# Altium footprint library 13-IC Packages-3pic.PcbLib: 49 footprints (part 1 of 4)
Each footprint in its own frame and in the unit in brackets; x right, y up, seen from the top. Pads: shape width x height; smd on the part's side, far side on the other; paste and mask are expansions set on the pad; w line width, h text height; cw(c..) or ccw(c..) is an arc to the next point about the centre after c.
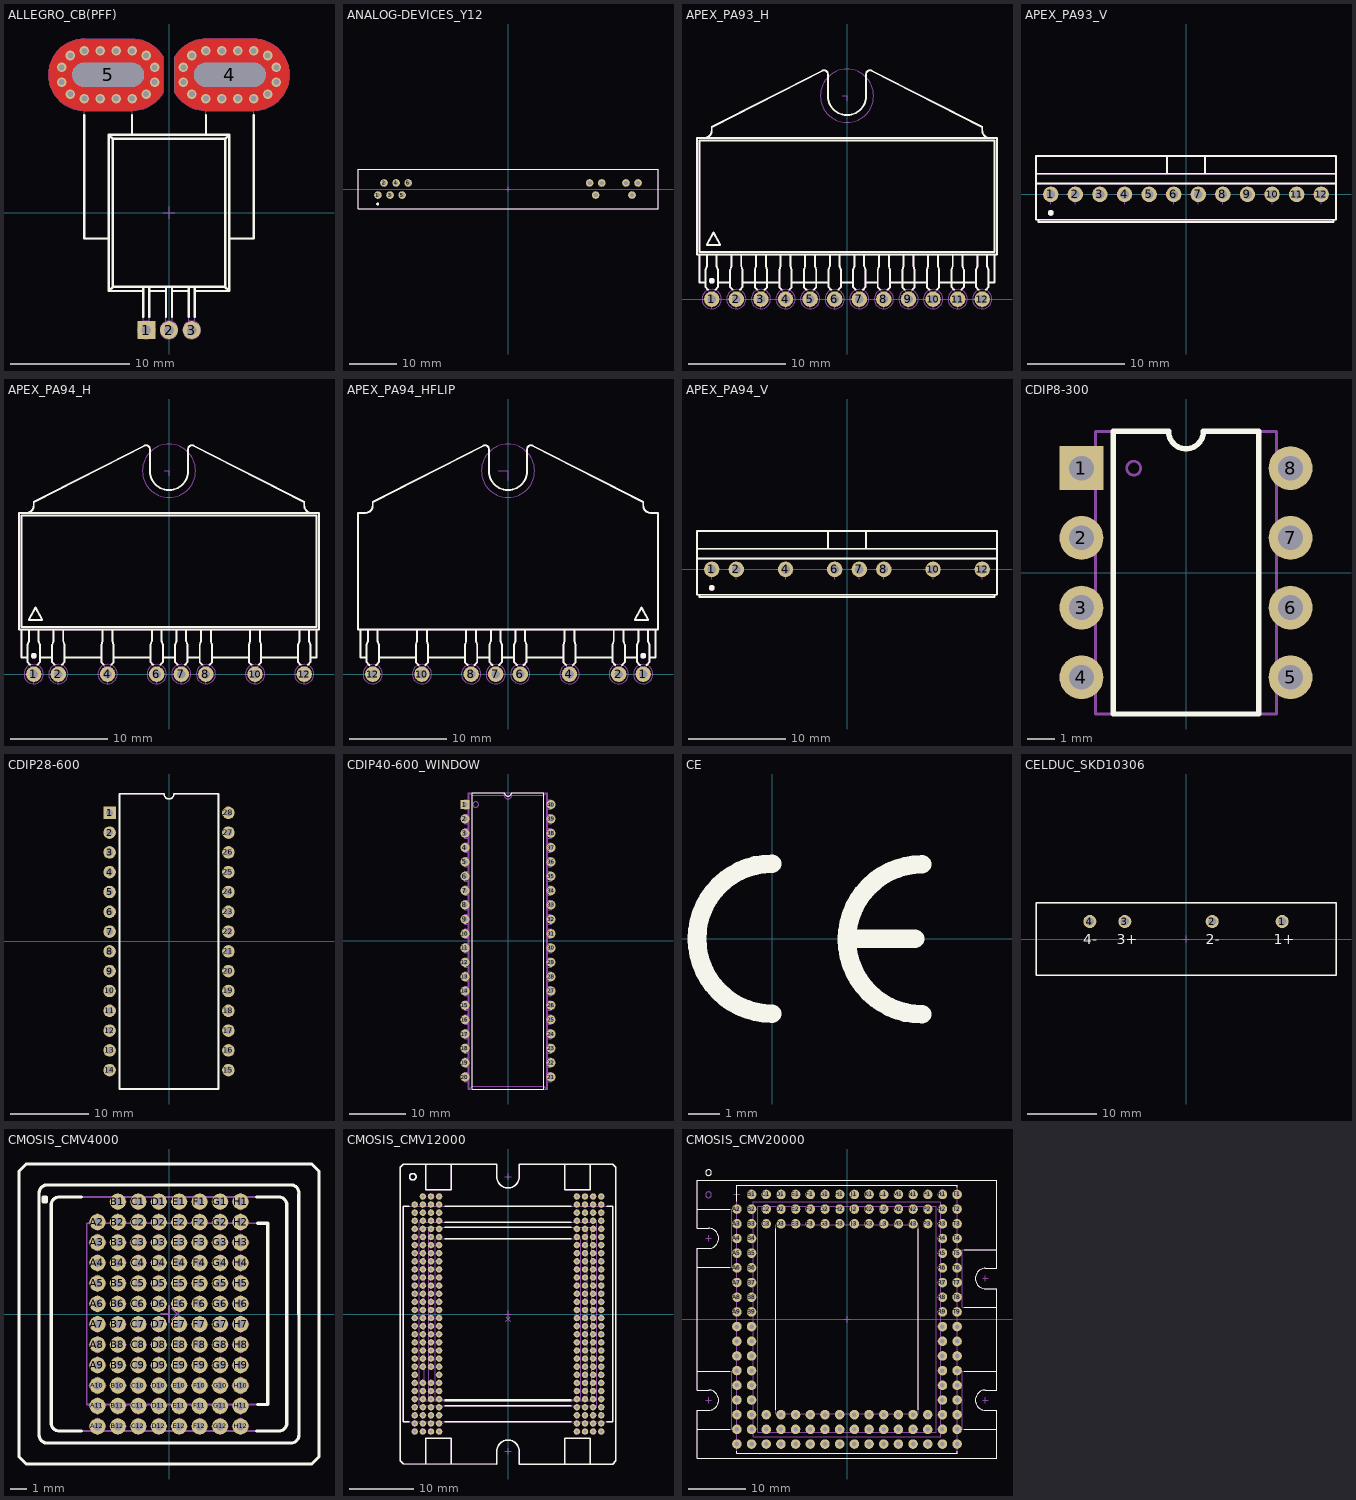
[diagram p0: the footprints below, top view; thin cyan lines are the x and y axes]

## ALLEGRO_CB(PFF) [mm] "ALLGRO MICROSYSTEMS Package CB, 5-pin package, leadform PFF"
height 7.1
pads (5):
  rect 1.5x1.5 hole 0.8: 1(-1.9,-9.822)
  round 1.5 hole 0.8: 2(0,-9.822) 3(1.9,-9.822)
  rrect100% 6x2 hole 2 slot 6 at 0 deg: 4(5.1,11.578) 5(-5.1,11.578)
via -7.1,13.578 diameter 0.8 hole 0.5
via -5.77,13.578 diameter 0.8 hole 0.5
via -4.43,13.578 diameter 0.8 hole 0.5
via -3.1,13.578 diameter 0.8 hole 0.5
via -1.924,13.196 diameter 0.8 hole 0.5
via -1.198,12.196 diameter 0.8 hole 0.5
via -1.198,10.96 diameter 0.8 hole 0.5
via -1.924,9.96 diameter 0.8 hole 0.5
via -3.1,9.578 diameter 0.8 hole 0.5
via -4.43,9.578 diameter 0.8 hole 0.5
via -5.77,9.578 diameter 0.8 hole 0.5
via -7.1,9.578 diameter 0.8 hole 0.5
via -8.276,9.96 diameter 0.8 hole 0.5
via -9.002,10.96 diameter 0.8 hole 0.5
via -9.002,12.196 diameter 0.8 hole 0.5
via -8.276,13.196 diameter 0.8 hole 0.5
via 1.198,12.196 diameter 0.8 hole 0.5
via 1.924,13.196 diameter 0.8 hole 0.5
via 3.1,13.578 diameter 0.8 hole 0.5
via 4.43,13.578 diameter 0.8 hole 0.5
via 5.77,13.578 diameter 0.8 hole 0.5
via 7.1,13.578 diameter 0.8 hole 0.5
via 8.276,13.196 diameter 0.8 hole 0.5
via 9.002,12.196 diameter 0.8 hole 0.5
via 9.002,10.96 diameter 0.8 hole 0.5
via 8.276,9.96 diameter 0.8 hole 0.5
via 7.1,9.578 diameter 0.8 hole 0.5
via 5.77,9.578 diameter 0.8 hole 0.5
via 4.43,9.578 diameter 0.8 hole 0.5
via 3.1,9.578 diameter 0.8 hole 0.5
via 1.924,9.96 diameter 0.8 hole 0.5
via 1.198,10.96 diameter 0.8 hole 0.5
Top Layer:
  region: -7.1,8.578 -7.336,8.578 -7.803,8.652 -8.252,8.798 -8.672,9.012 -9.054,9.29 -9.388,9.623 -9.666,10.005 -9.88,10.426 -10.026,10.875 -10.1,11.342 -10.1,11.814 -10.026,12.28 -9.88,12.729 -9.666,13.15 -9.388,13.532 -9.054,13.866 -8.672,14.144 -8.252,14.358 -7.803,14.504 -7.336,14.578 -7.1,14.578 -3.1,14.578 -2.903,14.578 -2.513,14.526 -2.132,14.424 -1.769,14.273 -1.428,14.076 -1.116,13.836 -0.838,13.558 -0.598,13.245 -0.5,13.074 -0.5,10.081 -0.598,9.91 -0.838,9.598 -1.116,9.319 -1.428,9.079 -1.769,8.882 -2.132,8.731 -2.513,8.629 -2.903,8.578 -3.1,8.578
  region: 0.5,10.081 0.598,9.91 0.838,9.598 1.116,9.319 1.428,9.079 1.769,8.882 2.132,8.731 2.513,8.629 2.903,8.578 3.1,8.578 7.1,8.578 7.336,8.578 7.803,8.652 8.252,8.798 8.672,9.012 9.054,9.29 9.388,9.623 9.666,10.005 9.88,10.426 10.026,10.875 10.1,11.342 10.1,11.814 10.026,12.28 9.88,12.729 9.666,13.15 9.388,13.532 9.054,13.866 8.672,14.144 8.252,14.358 7.803,14.504 7.336,14.578 7.1,14.578 3.1,14.578 2.903,14.578 2.513,14.526 2.132,14.424 1.769,14.273 1.428,14.076 1.116,13.836 0.838,13.558 0.598,13.245 0.5,13.074
Bottom Layer:
  region: -7.1,8.578 -7.336,8.578 -7.803,8.652 -8.252,8.798 -8.672,9.012 -9.054,9.29 -9.388,9.623 -9.666,10.005 -9.88,10.426 -10.026,10.875 -10.1,11.342 -10.1,11.814 -10.026,12.28 -9.88,12.729 -9.666,13.15 -9.388,13.532 -9.054,13.866 -8.672,14.144 -8.252,14.358 -7.803,14.504 -7.336,14.578 -7.1,14.578 -3.1,14.578 -2.903,14.578 -2.513,14.526 -2.132,14.424 -1.769,14.273 -1.428,14.076 -1.116,13.836 -0.838,13.558 -0.598,13.245 -0.5,13.074 -0.5,10.081 -0.598,9.91 -0.838,9.598 -1.116,9.319 -1.428,9.079 -1.769,8.882 -2.132,8.731 -2.513,8.629 -2.903,8.578 -3.1,8.578
  region: 0.5,10.081 0.598,9.91 0.838,9.598 1.116,9.319 1.428,9.079 1.769,8.882 2.132,8.731 2.513,8.629 2.903,8.578 3.1,8.578 7.1,8.578 7.336,8.578 7.803,8.652 8.252,8.798 8.672,9.012 9.054,9.29 9.388,9.623 9.666,10.005 9.88,10.426 10.026,10.875 10.1,11.342 10.1,11.814 10.026,12.28 9.88,12.729 9.666,13.15 9.388,13.532 9.054,13.866 8.672,14.144 8.252,14.358 7.803,14.504 7.336,14.578 7.1,14.578 3.1,14.578 2.903,14.578 2.513,14.526 2.132,14.424 1.769,14.273 1.428,14.076 1.116,13.836 0.838,13.558 0.598,13.245 0.5,13.074
Top Overlay:
  lines w0.2: -7.1,8.178 -7.1,-2.15 -5.1,-2.15 ; -3.1,6.55 -3.1,8.178 ; -2.155,-8.701 -2.155,-6.2 ; -2.155,-6.55 -5.05,-6.55 ; -1.645,-8.701 -1.645,-6.2 ; -1.645,-6.55 -0.255,-6.55 ; -0.255,-8.701 -0.255,-6.2 ; 0.255,-8.701 0.255,-6.2 ; 0.255,-6.55 1.645,-6.55 ; 1.645,-8.701 1.645,-6.2 ; 2.155,-8.701 2.155,-6.2 ; 2.155,-6.55 5.05,-6.55 ; 3.1,6.55 3.1,8.178 ; 5.1,-2.15 7.1,-2.15 7.1,8.178 ; -5.05,-6.55 -4.7,-6.2 ; -5.05,-6.55 -5.05,6.55 ; -5.05,6.55 -4.7,6.2 ; -5.05,6.55 5.05,6.55 ; -4.7,-6.2 -4.7,6.2 ; -4.7,-6.2 4.7,-6.2 ; -4.7,6.2 4.7,6.2 ; 4.7,-6.2 4.7,6.2 ; 4.7,-6.2 5.05,-6.55 ; 4.7,6.2 5.05,6.55 ; 5.05,-6.55 5.05,6.55
Mechanical 8:
  drawing of 258 lines, arcs and shapes, not listed
Mechanical 14:
  lines w0.1: -5.1,-2.15 -7.1,-2.15 -7.1,12.45 -3.1,12.45 -3.1,6.55 ; -2.155,-6.55 -5.05,-6.55 ; -2.155,-6.2 -2.155,-10.319 -1.645,-10.319 -1.645,-6.2 ; -1.645,-6.55 -0.255,-6.55 ; -0.255,-6.2 -0.255,-10.319 0.255,-10.319 0.255,-6.2 ; 0.255,-6.55 1.645,-6.55 ; 1.645,-6.2 1.645,-10.319 2.155,-10.319 2.155,-6.2 ; 2.155,-6.55 5.05,-6.55 ; 3.1,6.55 3.1,12.45 7.1,12.45 7.1,-2.15 5.1,-2.15 ; -5.05,-6.55 -4.7,-6.2 ; -5.05,-6.55 -5.05,6.55 ; -5.05,6.55 -4.7,6.2 ; -5.05,6.55 5.05,6.55 ; -4.7,-6.2 -4.7,6.2 ; -4.7,-6.2 4.7,-6.2 ; -4.7,6.2 4.7,6.2 ; 4.7,-6.2 4.7,6.2 ; 4.7,-6.2 5.05,-6.55 ; 4.7,6.2 5.05,6.55 ; 5.05,-6.55 5.05,6.55
3D body "ALLEGRO_CB(PFF).stp": height 7.1, standoff -3.5, extent -7.1,-10.319 7.1,12.45

## ANALOG-DEVICES_Y12 [mm] "Power SIP, Y12 Package Style, Pitch 2.54mm, Body 63mm X 8.3mm"
height 6.86
pads (12):
  round 1.6 hole 0.9: 1(-27.305,-1.27) 2(-26.035,1.27) 3(-24.765,-1.27) 4(-23.495,1.27) 5(-22.225,-1.27) 6(-20.955,1.27) 36(17.145,1.27) 37(18.415,-1.27) 38(19.685,1.27) 42(24.765,1.27) 43(26.035,-1.27) 44(27.305,1.27)
Top Overlay:
  circle w0.3: c-27.37,-3.155 r0.15
  lines w0.2: -31.496,-4.128 -31.496,4.128 31.496,4.128 31.496,-4.128 -31.496,-4.128
Mechanical 8:
  lines w0.1: -27.805,-1.27 -27.305,-1.27 ; -27.305,-1.77 -27.305,-1.27 ; -27.305,-0.77 -27.305,-1.27 ; -26.805,-1.27 -27.305,-1.27 ; -26.535,1.27 -26.035,1.27 ; -26.035,0.77 -26.035,1.27 ; -26.035,1.77 -26.035,1.27 ; -25.535,1.27 -26.035,1.27 ; -25.265,-1.27 -24.765,-1.27 ; -24.765,-1.77 -24.765,-1.27 ; -24.765,-0.77 -24.765,-1.27 ; -24.265,-1.27 -24.765,-1.27 ; -23.995,1.27 -23.495,1.27 ; -23.495,0.77 -23.495,1.27 ; -23.495,1.77 -23.495,1.27 ; -22.995,1.27 -23.495,1.27 ; -22.725,-1.27 -22.225,-1.27 ; -22.225,-1.77 -22.225,-1.27 ; -22.225,-0.77 -22.225,-1.27 ; -21.725,-1.27 -22.225,-1.27 ; -21.455,1.27 -20.955,1.27 ; -20.955,0.77 -20.955,1.27 ; -20.955,1.77 -20.955,1.27 ; -20.455,1.27 -20.955,1.27 ; -0.5,0 0,0 ; 0,-0.5 0,0 ; 0,0.5 0,0 ; 0.5,0 0,0 ; 16.645,1.27 17.145,1.27 ; 17.145,0.77 17.145,1.27 ; 17.145,1.77 17.145,1.27 ; 17.645,1.27 17.145,1.27 ; 17.915,-1.27 18.415,-1.27 ; 18.415,-1.77 18.415,-1.27 ; 18.415,-0.77 18.415,-1.27 ; 18.915,-1.27 18.415,-1.27 ; 19.185,1.27 19.685,1.27 ; 19.685,0.77 19.685,1.27 ; 19.685,1.77 19.685,1.27 ; 20.185,1.27 19.685,1.27 ; 24.265,1.27 24.765,1.27 ; 24.765,0.77 24.765,1.27 ; 24.765,1.77 24.765,1.27 ; 25.265,1.27 24.765,1.27 ; 25.535,-1.27 26.035,-1.27 ; 26.035,-1.77 26.035,-1.27 ; 26.035,-0.77 26.035,-1.27 ; 26.535,-1.27 26.035,-1.27 ; 26.805,1.27 27.305,1.27 ; 27.305,0.77 27.305,1.27 ; 27.305,1.77 27.305,1.27 ; 27.805,1.27 27.305,1.27
Mechanical 14:
  circle w0.3: c-27.37,-3.155 r0.15
  lines w0.1: -31.496,-4.128 -31.496,4.128 31.496,4.128 31.496,-4.128 -31.496,-4.128
3D body "ANALOG-DEVICES_Y12.stp": height 21.34, standoff -3.6, extent -31.446,-4.177 31.546,4.078

## APEX_PA93_H [mm] "Power SIP, EC Package Style, Pitch 2.54mm, Right Angle Formed Leads For Horizontal Mount"
height 6.86
pads (12):
  round 1.6 hole 0.9: 1(-13.97,0) 2(-11.43,0) 3(-8.89,0) 4(-6.35,0) 5(-3.81,0) 6(-1.27,0) 7(1.27,0) 8(3.81,0) 9(6.35,0) 10(8.89,0) 11(11.43,0) 12(13.97,0)
Top Overlay:
  circle w0.3: c-13.97,1.905 r0.15
  lines w0.2: -15.24,4.595 -15.24,1.725 -14.605,1.725 ; -14.732,16.66 ccw(c-14.732,17.422) -13.97,17.422 -13.97,17.777 -2.535,23.603 cw(c-2.362,23.264) -1.981,23.264 -1.981,21.003 ccw(c0,21.003) 1.981,21.003 1.981,23.264 cw(c2.362,23.264) 2.535,23.603 13.97,17.777 13.97,17.422 ccw(c14.732,17.422) 14.732,16.66 ; -14.478,4.595 -14.478,3.426 -14.605,3.02 -14.605,1.229 -14.36,0.984 ; -13.58,0.984 -13.335,1.229 -13.335,3.02 -13.462,3.426 -13.462,4.595 ; -13.335,1.725 -12.065,1.725 ; -11.938,4.595 -11.938,3.426 -12.065,3.02 -12.065,1.229 -11.82,0.984 ; -11.04,0.984 -10.795,1.229 -10.795,3.02 -10.922,3.426 -10.922,4.595 ; -10.795,1.725 -6.985,1.725 ; -9.398,4.595 -9.398,3.426 -9.525,3.02 -9.525,1.229 -9.28,0.984 ; -8.5,0.984 -8.255,1.229 -8.255,3.02 -8.382,3.426 -8.382,4.595 ; -6.858,4.595 -6.858,3.426 -6.985,3.02 -6.985,1.229 -6.74,0.984 ; -5.96,0.984 -5.715,1.229 -5.715,3.02 -5.842,3.426 -5.842,4.595 ; -5.715,1.725 -1.905,1.725 ; -4.318,4.595 -4.318,3.426 -4.445,3.02 -4.445,1.229 -4.2,0.984 ; -3.42,0.984 -3.175,1.229 -3.175,3.02 -3.302,3.426 -3.302,4.595 ; -1.778,4.595 -1.778,3.426 -1.905,3.02 -1.905,1.229 -1.66,0.984 ; -0.88,0.984 -0.635,1.229 -0.635,3.02 -0.762,3.426 -0.762,4.595 ; -0.635,1.725 0.635,1.725 ; 0.762,4.595 0.762,3.426 0.635,3.02 0.635,1.229 0.88,0.984 ; 1.66,0.984 1.905,1.229 1.905,3.02 1.778,3.426 1.778,4.595 ; 1.905,1.725 3.175,1.725 ; 3.302,4.595 3.302,3.426 3.175,3.02 3.175,1.229 3.42,0.984 ; 4.2,0.984 4.445,1.229 4.445,3.02 4.318,3.426 4.318,4.595 ; 4.445,1.725 8.255,1.725 ; 5.842,4.595 5.842,3.426 5.715,3.02 5.715,1.229 5.96,0.984 ; 6.74,0.984 6.985,1.229 6.985,3.02 6.858,3.426 6.858,4.595 ; 8.382,4.595 8.382,3.426 8.255,3.02 8.255,1.229 8.5,0.984 ; 9.28,0.984 9.525,1.229 9.525,3.02 9.398,3.426 9.398,4.595 ; 9.525,1.725 13.335,1.725 ; 10.922,4.595 10.922,3.426 10.795,3.02 10.795,1.229 11.04,0.984 ; 11.82,0.984 12.065,1.229 12.065,3.02 11.938,3.426 11.938,4.595 ; 13.462,4.595 13.462,3.426 13.335,3.02 13.335,1.229 13.58,0.984 ; 14.36,0.984 14.605,1.229 14.605,3.02 14.478,3.426 14.478,4.595 ; 14.605,1.725 15.24,1.725 15.24,4.595 ; -15.494,4.595 15.494,4.595 15.494,16.66 -15.494,16.66 -15.494,4.595 ; -15.24,4.849 15.24,4.849 15.24,16.406 -15.24,16.406 -15.24,4.849 ; -14.478,5.611 -13.785,6.881 -13.093,5.611 -14.478,5.611
Mechanical 8:
  circle w0.1: c11.43,0.003 r1
  circle w0.1: c6.35,0.003 r1
  circle w0.1: c-3.81,0.003 r1
  circle w0.1: c-8.89,0.003 r1
  circle w0.1: c0,21.003 r2.75
  circle w0.1: c-13.97,0.003 r1
  circle w0.1: c-11.43,0.003 r1
  circle w0.1: c-6.35,0.003 r1
  circle w0.1: c-1.27,0.003 r1
  circle w0.1: c1.27,0.003 r1
  circle w0.1: c3.81,0.003 r1
  circle w0.1: c8.89,0.003 r1
  circle w0.1: c13.97,0.003 r1
  lines w0.1: -14.97,0.003 -13.97,0.003 -13.97,-0.997 ; -14.36,0.984 cw(c-14.719,0.625) -14.32,0.94 ; -13.62,0.94 cw(c-13.221,0.625) -13.58,0.984 ; -12.43,0.003 -11.43,0.003 -11.43,-0.997 ; -11.82,0.984 cw(c-12.179,0.625) -11.78,0.94 ; -11.08,0.94 cw(c-10.681,0.625) -11.04,0.984 ; -9.89,0.003 -8.89,0.003 -8.89,-0.997 ; -9.28,0.984 cw(c-9.639,0.625) -9.24,0.94 ; -8.54,0.94 cw(c-8.141,0.625) -8.5,0.984 ; -7.35,0.003 -6.35,0.003 -6.35,-0.997 ; -6.74,0.984 cw(c-7.099,0.625) -6.7,0.94 ; -6,0.94 cw(c-5.601,0.625) -5.96,0.984 ; -4.81,0.003 -3.81,0.003 -3.81,-0.997 ; -4.2,0.984 cw(c-4.559,0.625) -4.16,0.94 ; -3.46,0.94 cw(c-3.061,0.625) -3.42,0.984 ; -2.27,0.003 -1.27,0.003 -1.27,-0.997 ; -1.66,0.984 cw(c-2.019,0.625) -1.62,0.94 ; -0.92,0.94 cw(c-0.521,0.625) -0.88,0.984 ; -0.508,21.003 0,21.003 0,20.495 ; 0.27,0.003 1.27,0.003 1.27,-0.997 ; 0.88,0.984 cw(c0.521,0.625) 0.92,0.94 ; 1.62,0.94 cw(c2.019,0.625) 1.66,0.984 ; 2.81,0.003 3.81,0.003 3.81,-0.997 ; 3.42,0.984 cw(c3.061,0.625) 3.46,0.94 ; 4.16,0.94 cw(c4.559,0.625) 4.2,0.984 ; 5.35,0.003 6.35,0.003 6.35,-0.997 ; 5.96,0.984 cw(c5.601,0.625) 6,0.94 ; 6.7,0.94 cw(c7.099,0.625) 6.74,0.984 ; 7.89,0.003 8.89,0.003 8.89,-0.997 ; 8.5,0.984 cw(c8.141,0.625) 8.54,0.94 ; 9.24,0.94 cw(c9.639,0.625) 9.28,0.984 ; 10.43,0.003 11.43,0.003 11.43,-0.997 ; 11.04,0.984 cw(c10.681,0.625) 11.08,0.94 ; 11.78,0.94 cw(c12.179,0.625) 11.82,0.984 ; 12.97,0.003 13.97,0.003 13.97,-0.997 ; 13.58,0.984 cw(c13.221,0.625) 13.62,0.94 ; 14.32,0.94 cw(c14.719,0.625) 14.36,0.984
  text "! ADD COPPER & TOP SOLDER FOR CASE !" at -15.24,10.795 h1
Mechanical 14:
  drawing of 190 lines, arcs and shapes, not listed
3D body "APEX_PA93_h.stp": height 6.86, standoff -1.86, extent -15.494,-0.213 15.494,23.645

## APEX_PA93_V [mm] "Power 12 Pin SIP, DP Package Style, Pitch 2.54mm, Straight Leads For Vertical Mount"
height 23.14
pads (12):
  round 1.6 hole 0.9: 1(-13.97,0) 2(-11.43,0) 3(-8.89,0) 4(-6.35,0) 5(-3.81,0) 6(-1.27,0) 7(1.27,0) 8(3.81,0) 9(6.35,0) 10(8.89,0) 11(11.43,0) 12(13.97,0)
Top Overlay:
  circle w0.3: c-13.97,-1.905 r0.15
  lines w0.2: -15.494,1.118 15.494,1.118 ; -15.494,2.134 15.494,2.134 ; -15.24,-2.616 -15.24,-2.87 15.24,-2.87 15.24,-2.616 ; -1.981,2.134 -1.981,3.988 ; 1.981,2.134 1.981,3.988 ; -15.494,-2.616 -15.494,3.988 15.494,3.988 15.494,-2.616 -15.494,-2.616
Mechanical 8:
  lines w0.1: -14.97,0 -13.97,0 -13.97,-1 ; -14.211,-0.216 -14.211,0.216 ; -13.729,-0.216 -13.729,0.216 ; -12.43,0 -11.43,0 -11.43,-1 ; -11.671,-0.216 -11.671,0.216 ; -11.189,-0.216 -11.189,0.216 ; -7.35,0 -6.35,0 -6.35,-1 ; -6.591,-0.216 -6.591,0.216 ; -6.109,-0.216 -6.109,0.216 ; -2.27,0 -1.27,0 -1.27,-1 ; -1.511,-0.216 -1.511,0.216 ; -1.029,-0.216 -1.029,0.216 ; 0.27,0 1.27,0 1.27,-1 ; 1.029,-0.216 1.029,0.216 ; 1.511,-0.216 1.511,0.216 ; 2.81,0 3.81,0 3.81,-1 ; 3.569,-0.216 3.569,0.216 ; 4.051,-0.216 4.051,0.216 ; 7.89,0 8.89,0 8.89,-1 ; 8.649,-0.216 8.649,0.216 ; 9.131,-0.216 9.131,0.216 ; 12.97,0 13.97,0 13.97,-1 ; 13.729,-0.216 13.729,0.216 ; 14.211,-0.216 14.211,0.216 ; -14.605,-0.216 -14.605,0.216 -13.335,0.216 -13.335,-0.216 -14.605,-0.216 ; -12.065,-0.216 -12.065,0.216 -10.795,0.216 -10.795,-0.216 -12.065,-0.216 ; -6.985,-0.216 -6.985,0.216 -5.715,0.216 -5.715,-0.216 -6.985,-0.216 ; -1.905,-0.216 -1.905,0.216 -0.635,0.216 -0.635,-0.216 -1.905,-0.216 ; 0.635,-0.216 0.635,0.216 1.905,0.216 1.905,-0.216 0.635,-0.216 ; 3.175,-0.216 3.175,0.216 4.445,0.216 4.445,-0.216 3.175,-0.216 ; 8.255,-0.216 8.255,0.216 9.525,0.216 9.525,-0.216 8.255,-0.216 ; 13.335,-0.216 13.335,0.216 14.605,0.216 14.605,-0.216 13.335,-0.216
Mechanical 14:
  circle w0.3: c-13.97,-1.905 r0.15
  lines w0.1: -15.494,1.118 15.494,1.118 ; -15.494,2.134 15.494,2.134 ; -15.24,-2.616 -15.24,-2.87 15.24,-2.87 15.24,-2.616 ; -1.981,2.134 -1.981,3.988 ; 1.981,2.134 1.981,3.988 ; -15.494,-2.616 -15.494,3.988 15.494,3.988 15.494,-2.616 -15.494,-2.616
3D body "APEX_PA93_v.stp": height 23.14, standoff -3.1, extent -15.494,-2.87 15.494,3.988

## APEX_PA94_H [mm] "Power SIP, EC Package Style, Pitch 2.54mm, Right Angle Formed Leads For Horizontal Mount"
height 6.86
pads (8):
  round 1.6 hole 0.9: 1(-13.97,0) 2(-11.43,0) 4(-6.35,0) 6(-1.27,0) 7(1.27,0) 8(3.81,0) 10(8.89,0) 12(13.97,0)
Top Overlay:
  circle w0.3: c-13.97,1.905 r0.15
  lines w0.2: -15.24,4.595 -15.24,1.725 -14.605,1.725 ; -14.732,16.66 ccw(c-14.732,17.422) -13.97,17.422 -13.97,17.777 -2.535,23.603 cw(c-2.362,23.264) -1.981,23.264 -1.981,21.003 ccw(c0,21.003) 1.981,21.003 1.981,23.264 cw(c2.362,23.264) 2.535,23.603 13.97,17.777 13.97,17.422 ccw(c14.732,17.422) 14.732,16.66 ; -14.478,4.595 -14.478,3.426 -14.605,3.02 -14.605,1.229 -14.36,0.984 ; -13.58,0.984 -13.335,1.229 -13.335,3.02 -13.462,3.426 -13.462,4.595 ; -13.335,1.725 -12.065,1.725 ; -11.938,4.595 -11.938,3.426 -12.065,3.02 -12.065,1.229 -11.82,0.984 ; -11.04,0.984 -10.795,1.229 -10.795,3.02 -10.922,3.426 -10.922,4.595 ; -10.795,1.725 -6.985,1.725 ; -6.858,4.595 -6.858,3.426 -6.985,3.02 -6.985,1.229 -6.74,0.984 ; -5.96,0.984 -5.715,1.229 -5.715,3.02 -5.842,3.426 -5.842,4.595 ; -5.715,1.725 -1.905,1.725 ; -1.778,4.595 -1.778,3.426 -1.905,3.02 -1.905,1.229 -1.66,0.984 ; -0.88,0.984 -0.635,1.229 -0.635,3.02 -0.762,3.426 -0.762,4.595 ; -0.635,1.725 0.635,1.725 ; 0.762,4.595 0.762,3.426 0.635,3.02 0.635,1.229 0.88,0.984 ; 1.66,0.984 1.905,1.229 1.905,3.02 1.778,3.426 1.778,4.595 ; 1.905,1.725 3.175,1.725 ; 3.302,4.595 3.302,3.426 3.175,3.02 3.175,1.229 3.42,0.984 ; 4.2,0.984 4.445,1.229 4.445,3.02 4.318,3.426 4.318,4.595 ; 4.445,1.725 8.255,1.725 ; 8.382,4.595 8.382,3.426 8.255,3.02 8.255,1.229 8.5,0.984 ; 9.28,0.984 9.525,1.229 9.525,3.02 9.398,3.426 9.398,4.595 ; 9.525,1.725 13.335,1.725 ; 13.462,4.595 13.462,3.426 13.335,3.02 13.335,1.229 13.58,0.984 ; 14.36,0.984 14.605,1.229 14.605,3.02 14.478,3.426 14.478,4.595 ; 14.605,1.725 15.24,1.725 15.24,4.595 ; -15.494,4.595 15.494,4.595 15.494,16.66 -15.494,16.66 -15.494,4.595 ; -15.24,4.849 15.24,4.849 15.24,16.406 -15.24,16.406 -15.24,4.849 ; -14.478,5.611 -13.785,6.881 -13.093,5.611 -14.478,5.611
Mechanical 8:
  circle w0.1: c0,21.003 r2.75
  circle w0.1: c-13.97,0.003 r1
  circle w0.1: c-11.43,0.003 r1
  circle w0.1: c-6.35,0.003 r1
  circle w0.1: c-1.27,0.003 r1
  circle w0.1: c1.27,0.003 r1
  circle w0.1: c3.81,0.003 r1
  circle w0.1: c8.89,0.003 r1
  circle w0.1: c13.97,0.003 r1
  lines w0.1: -14.97,0.003 -13.97,0.003 -13.97,-0.997 ; -14.36,0.984 cw(c-14.719,0.625) -14.32,0.94 ; -13.62,0.94 cw(c-13.221,0.625) -13.58,0.984 ; -12.43,0.003 -11.43,0.003 -11.43,-0.997 ; -11.82,0.984 cw(c-12.179,0.625) -11.78,0.94 ; -11.08,0.94 cw(c-10.681,0.625) -11.04,0.984 ; -7.35,0.003 -6.35,0.003 -6.35,-0.997 ; -6.74,0.984 cw(c-7.099,0.625) -6.7,0.94 ; -6,0.94 cw(c-5.601,0.625) -5.96,0.984 ; -2.27,0.003 -1.27,0.003 -1.27,-0.997 ; -1.66,0.984 cw(c-2.019,0.625) -1.62,0.94 ; -0.92,0.94 cw(c-0.521,0.625) -0.88,0.984 ; -0.508,21.003 0,21.003 0,20.495 ; 0.27,0.003 1.27,0.003 1.27,-0.997 ; 0.88,0.984 cw(c0.521,0.625) 0.92,0.94 ; 1.62,0.94 cw(c2.019,0.625) 1.66,0.984 ; 2.81,0.003 3.81,0.003 3.81,-0.997 ; 3.42,0.984 cw(c3.061,0.625) 3.46,0.94 ; 4.16,0.94 cw(c4.559,0.625) 4.2,0.984 ; 7.89,0.003 8.89,0.003 8.89,-0.997 ; 8.5,0.984 cw(c8.141,0.625) 8.54,0.94 ; 9.24,0.94 cw(c9.639,0.625) 9.28,0.984 ; 12.97,0.003 13.97,0.003 13.97,-0.997 ; 13.58,0.984 cw(c13.221,0.625) 13.62,0.94 ; 14.32,0.94 cw(c14.719,0.625) 14.36,0.984
  text "! ADD COPPER & TOP SOLDER FOR CASE !" at -15.24,10.795 h1
Mechanical 14:
  circle w0.3: c-13.97,1.905 r0.15
  lines w0.1: -15.24,4.595 -15.24,1.725 -14.605,1.725 ; -14.732,16.66 ccw(c-14.732,17.422) -13.97,17.422 -13.97,17.777 -2.535,23.603 cw(c-2.362,23.264) -1.981,23.264 -1.981,21.003 ccw(c0,21.003) 1.981,21.003 1.981,23.264 cw(c2.362,23.264) 2.535,23.603 13.97,17.777 13.97,17.422 ccw(c14.732,17.422) 14.732,16.66 ; -14.478,4.595 -14.478,3.426 -14.605,3.02 -14.605,1.229 -14.36,0.984 cw(c-14.719,0.625) -14.211,0.625 -14.211,-0.213 -13.729,-0.213 -13.729,0.625 cw(c-13.221,0.625) -13.58,0.984 -13.335,1.229 -13.335,3.02 -13.462,3.426 -13.462,4.595 ; -13.335,1.725 -12.065,1.725 ; -11.938,4.595 -11.938,3.426 -12.065,3.02 -12.065,1.229 -11.82,0.984 cw(c-12.179,0.625) -11.671,0.625 -11.671,-0.213 -11.189,-0.213 -11.189,0.625 cw(c-10.681,0.625) -11.04,0.984 -10.795,1.229 -10.795,3.02 -10.922,3.426 -10.922,4.595 ; -10.795,1.725 -6.985,1.725 ; -6.858,4.595 -6.858,3.426 -6.985,3.02 -6.985,1.229 -6.74,0.984 cw(c-7.099,0.625) -6.591,0.625 -6.591,-0.213 -6.109,-0.213 -6.109,0.625 cw(c-5.601,0.625) -5.96,0.984 -5.715,1.229 -5.715,3.02 -5.842,3.426 -5.842,4.595 ; -5.715,1.725 -1.905,1.725 ; -1.778,4.595 -1.778,3.426 -1.905,3.02 -1.905,1.229 -1.66,0.984 cw(c-2.019,0.625) -1.511,0.625 -1.511,-0.213 -1.029,-0.213 -1.029,0.625 cw(c-0.521,0.625) -0.88,0.984 -0.635,1.229 -0.635,3.02 -0.762,3.426 -0.762,4.595 ; -0.635,1.725 0.635,1.725 ; 0.762,4.595 0.762,3.426 0.635,3.02 0.635,1.229 0.88,0.984 cw(c0.521,0.625) 1.029,0.625 1.029,-0.213 1.511,-0.213 1.511,0.625 cw(c2.019,0.625) 1.66,0.984 1.905,1.229 1.905,3.02 1.778,3.426 1.778,4.595 ; 1.905,1.725 3.175,1.725 ; 3.302,4.595 3.302,3.426 3.175,3.02 3.175,1.229 3.42,0.984 cw(c3.061,0.625) 3.569,0.625 3.569,-0.213 4.051,-0.213 4.051,0.625 cw(c4.559,0.625) 4.2,0.984 4.445,1.229 4.445,3.02 4.318,3.426 4.318,4.595 ; 4.445,1.725 8.255,1.725 ; 8.382,4.595 8.382,3.426 8.255,3.02 8.255,1.229 8.5,0.984 cw(c8.141,0.625) 8.649,0.625 8.649,-0.213 9.131,-0.213 9.131,0.625 cw(c9.639,0.625) 9.28,0.984 9.525,1.229 9.525,3.02 9.398,3.426 9.398,4.595 ; 9.525,1.725 13.335,1.725 ; 13.462,4.595 13.462,3.426 13.335,3.02 13.335,1.229 13.58,0.984 cw(c13.221,0.625) 13.729,0.625 13.729,-0.213 14.211,-0.213 14.211,0.625 cw(c14.719,0.625) 14.36,0.984 14.605,1.229 14.605,3.02 14.478,3.426 14.478,4.595 ; 14.605,1.725 15.24,1.725 15.24,4.595 ; -15.494,4.595 15.494,4.595 15.494,16.66 -15.494,16.66 -15.494,4.595 ; -15.24,4.849 15.24,4.849 15.24,16.406 -15.24,16.406 -15.24,4.849 ; -14.478,5.611 -13.785,6.881 -13.093,5.611 -14.478,5.611
3D body "APEX_PA94_h.stp": height 6.86, standoff -1.86, extent -15.494,-0.213 15.494,23.645
